# Altium footprint library ICs And Semiconductors THD.PcbLib: 507 footprints (part 12 of 32)
Each footprint in its own frame and in the unit in brackets; x right, y up, seen from the top. Pads: shape width x height; smd on the part's side, far side on the other; paste and mask are expansions set on the pad; w line width, h text height; cw(c..) or ccw(c..) is an arc to the next point about the centre after c.
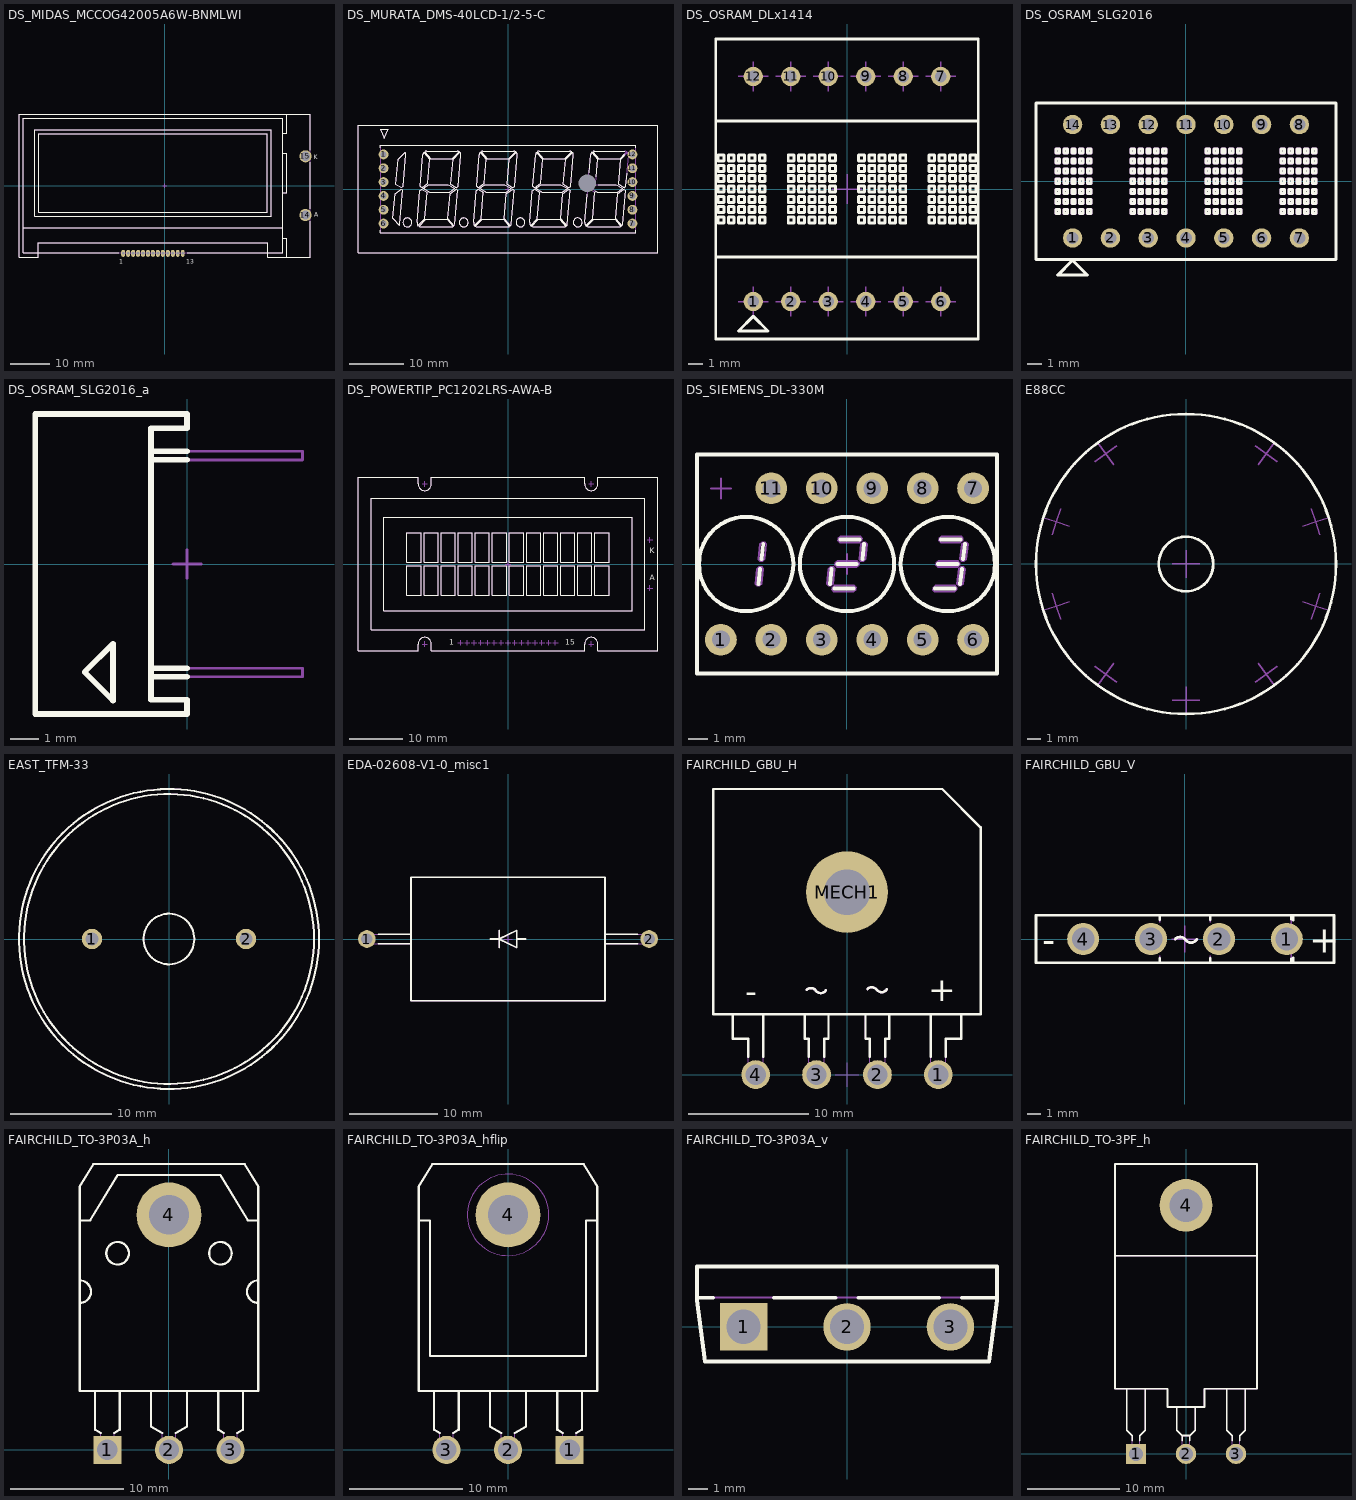
[diagram p11: the footprints below, top view; thin cyan lines are the x and y axes]

## DS_MIDAS_MCCOG42005A6W-BNMLWI [mm] "LCD Display 20 Characters (5x8 Dots) x 4 Lines, I2C, Body 74.5x36.6mm"
height 6.3
pads (15):
  oval 1x1.8 hole 0.7: 1(-10.62,-17.3) 2(-9.35,-17.3) 3(-8.08,-17.3) 4(-6.81,-17.3) 5(-5.54,-17.3) 6(-4.27,-17.3) 7(-3,-17.3) 8(-1.73,-17.3) 9(-0.46,-17.3) 10(0.81,-17.3) 11(2.08,-17.3) 12(3.35,-17.3) 13(4.62,-17.3)
  round 3.1 hole 2.4: 14(36,-7.5) 15(36,7.5)
Top Overlay:
  lines w0.2: -36.15,-10.7 30.15,-10.7 ; -11.72,-17.2 -36.15,-17.2 -36.15,17.2 30.15,17.2 30.15,-17.2 5.72,-17.2 ; 26.25,-7.84 27.25,-7.84 ; 30.15,-13.4 31.25,-13.4 31.25,-18.3 ; 30.15,-1.75 31.25,-1.75 31.25,8.25 30.15,8.25 ; 30.15,13.4 31.25,13.4 31.25,18.3 ; 37.25,-9.05 37.25,-18.3 31.25,-18.3 ; 37.25,-5.95 37.25,5.95 ; 37.25,9.05 37.25,18.3 -37.25,18.3 -37.25,-18.3 -32.35,-18.3 -32.35,-14.55 26.35,-14.55 26.35,-18.3 31.25,-18.3 ; 27.25,-7.84 -33.25,-7.84 -33.25,14.34 27.25,14.34 27.25,-7.84 ; -32.25,-6.84 26.25,-6.84 26.25,13.34 -32.25,13.34 -32.25,-6.84
  text "1" at -11.6,-20 h1.16
  text "13" at 5.539,-19.916 h1.16
  text "A" at 38.3,-8 h1.16
  text "K" at 38.1,6.8 h1.16
Notvisible:
  lines w0.05: -11.12,-17.3 -10.62,-17.3 ; -10.62,-17.8 -10.62,-17.3 ; -10.62,-16.8 -10.62,-17.3 ; -10.12,-17.3 -10.62,-17.3 ; -9.85,-17.3 -9.35,-17.3 ; -9.35,-17.8 -9.35,-17.3 ; -9.35,-16.8 -9.35,-17.3 ; -8.85,-17.3 -9.35,-17.3 ; -8.58,-17.3 -8.08,-17.3 ; -8.08,-17.8 -8.08,-17.3 ; -8.08,-16.8 -8.08,-17.3 ; -7.58,-17.3 -8.08,-17.3 ; -7.31,-17.3 -6.81,-17.3 ; -6.81,-17.8 -6.81,-17.3 ; -6.81,-16.8 -6.81,-17.3 ; -6.31,-17.3 -6.81,-17.3 ; -6.04,-17.3 -5.54,-17.3 ; -5.54,-17.8 -5.54,-17.3 ; -5.54,-16.8 -5.54,-17.3 ; -5.04,-17.3 -5.54,-17.3 ; -4.77,-17.3 -4.27,-17.3 ; -4.27,-17.8 -4.27,-17.3 ; -4.27,-16.8 -4.27,-17.3 ; -3.77,-17.3 -4.27,-17.3 ; -3.5,-17.3 -3,-17.3 ; -3,-17.8 -3,-17.3 ; -3,-16.8 -3,-17.3 ; -2.5,-17.3 -3,-17.3 ; -2.23,-17.3 -1.73,-17.3 ; -1.73,-17.8 -1.73,-17.3 ; -1.73,-16.8 -1.73,-17.3 ; -1.23,-17.3 -1.73,-17.3 ; -0.96,-17.3 -0.46,-17.3 ; -0.5,0 0,0 ; -0.46,-17.8 -0.46,-17.3 ; -0.46,-16.8 -0.46,-17.3 ; 0,-0.5 0,0 ; 0,0.5 0,0 ; 0.04,-17.3 -0.46,-17.3 ; 0.31,-17.3 0.81,-17.3 ; 0.5,0 0,0 ; 0.81,-17.8 0.81,-17.3 ; 0.81,-16.8 0.81,-17.3 ; 1.31,-17.3 0.81,-17.3 ; 1.58,-17.3 2.08,-17.3 ; 2.08,-17.8 2.08,-17.3 ; 2.08,-16.8 2.08,-17.3 ; 2.58,-17.3 2.08,-17.3 ; 2.85,-17.3 3.35,-17.3 ; 3.35,-17.8 3.35,-17.3 ; 3.35,-16.8 3.35,-17.3 ; 3.85,-17.3 3.35,-17.3 ; 4.12,-17.3 4.62,-17.3 ; 4.62,-17.8 4.62,-17.3 ; 4.62,-16.8 4.62,-17.3 ; 5.12,-17.3 4.62,-17.3 ; 35.5,-7.5 36,-7.5 ; 35.5,7.5 36,7.5 ; 36,-8 36,-7.5 ; 36,-7 36,-7.5 ; 36,7 36,7.5 ; 36,8 36,7.5 ; 36.5,-7.5 36,-7.5 ; 36.5,7.5 36,7.5
Mechanical 14:
  lines w0.1: -36.15,-10.7 30.15,-10.7 ; 30.15,-13.4 31.25,-13.4 31.25,-18.3 ; 30.15,-1.75 31.25,-1.75 31.25,8.25 30.15,8.25 ; 30.15,13.4 31.25,13.4 31.25,18.3 ; 31.25,-18.3 37.25,-18.3 37.25,18.3 -37.25,18.3 -37.25,-18.3 -32.35,-18.3 -32.35,-14.55 26.35,-14.55 26.35,-18.3 31.25,-18.3 ; -36.15,-17.2 -36.15,17.2 30.15,17.2 30.15,-17.2 -36.15,-17.2 ; -33.25,-7.84 27.25,-7.84 27.25,14.34 -33.25,14.34 -33.25,-7.84 ; -32.25,-6.84 26.25,-6.84 26.25,13.34 -32.25,13.34 -32.25,-6.84
  text "1" at -11.6,-20 h1.16
  text "13" at 5.539,-19.916 h1.16
  text "A" at 38.3,-8 h1.16
  text "K" at 38.2,6.9 h1.16
3D body "DS_MIDAS_MCCOG42005A6W-BNMLWI_part1.stp": height 6.2, standoff -3.6, extent -37.25,-18.3 37.25,18.3
3D body "DS_MIDAS_MCCOG42005A6W-BNMLWI_part2.stp": height 6.3, standoff 3, extent -37.25,-18.3 31.25,18.3

## DS_MURATA_DMS-40LCD-1/2-5-C [mm] "4 1/2 Digit, LCD Display Digital Panel Voltmeters, Body 55.1x23.4mm"
height 10.92
pads (13):
  round 1.8 hole 1.1: 1(-22.85,6.35) 2(-22.85,3.81) 3(-22.85,1.27) 4(-22.85,-1.27) 5(-22.85,-3.81) 6(-22.85,-6.35) 7(22.85,-6.35) 8(22.85,-3.81) 9(22.85,-1.27) 10(22.85,1.27) 11(22.85,3.81) 12(22.85,6.35)
  round 1 hole 3.2 unplated mask+1.1: 13(14.59,1.02)
Top Overlay:
  drawing of 191 lines, arcs and shapes, not listed
Notvisible:
  lines w0.1: -23.35,-6.35 -22.85,-6.35 ; -23.35,-3.81 -22.85,-3.81 ; -23.35,-1.27 -22.85,-1.27 ; -23.35,1.27 -22.85,1.27 ; -23.35,3.81 -22.85,3.81 ; -23.35,6.35 -22.85,6.35 ; -22.85,-6.85 -22.85,-6.35 ; -22.85,-5.85 -22.85,-6.35 ; -22.85,-4.31 -22.85,-3.81 ; -22.85,-3.31 -22.85,-3.81 ; -22.85,-1.77 -22.85,-1.27 ; -22.85,-0.77 -22.85,-1.27 ; -22.85,0.77 -22.85,1.27 ; -22.85,1.77 -22.85,1.27 ; -22.85,3.31 -22.85,3.81 ; -22.85,4.31 -22.85,3.81 ; -22.85,5.85 -22.85,6.35 ; -22.85,6.85 -22.85,6.35 ; -22.35,-6.35 -22.85,-6.35 ; -22.35,-3.81 -22.85,-3.81 ; -22.35,-1.27 -22.85,-1.27 ; -22.35,1.27 -22.85,1.27 ; -22.35,3.81 -22.85,3.81 ; -22.35,6.35 -22.85,6.35 ; -0.5,0 0,0 ; 0,-0.5 0,0 ; 0,0.5 0,0 ; 0.5,0 0,0 ; 14.09,1.02 14.59,1.02 ; 14.59,0.52 14.59,1.02 ; 14.59,1.52 14.59,1.02 ; 15.09,1.02 14.59,1.02 ; 22.35,-6.35 22.85,-6.35 ; 22.35,-3.81 22.85,-3.81 ; 22.35,-1.27 22.85,-1.27 ; 22.35,1.27 22.85,1.27 ; 22.35,3.81 22.85,3.81 ; 22.35,6.35 22.85,6.35 ; 22.85,-6.85 22.85,-6.35 ; 22.85,-5.85 22.85,-6.35 ; 22.85,-4.31 22.85,-3.81 ; 22.85,-3.31 22.85,-3.81 ; 22.85,-1.77 22.85,-1.27 ; 22.85,-0.77 22.85,-1.27 ; 22.85,0.77 22.85,1.27 ; 22.85,1.77 22.85,1.27 ; 22.85,3.31 22.85,3.81 ; 22.85,4.31 22.85,3.81 ; 22.85,5.85 22.85,6.35 ; 22.85,6.85 22.85,6.35 ; 23.35,-6.35 22.85,-6.35 ; 23.35,-3.81 22.85,-3.81 ; 23.35,-1.27 22.85,-1.27 ; 23.35,1.27 22.85,1.27 ; 23.35,3.81 22.85,3.81 ; 23.35,6.35 22.85,6.35
Mechanical 14:
  drawing of 195 lines, arcs and shapes, not listed
3D body "DS_MURATA_DMS-40LCD-1-2-5-C.stp": height 10.92, standoff -3.58, extent -27.55,-11.7 27.55,11.7

## DS_OSRAM_DLx1414 [mm] "0.145\" 4-Character 5 x 7 Dot Matrix Alphanumeric Intelligent Red Display, Body 20.32x17.78mm"
height 6.1
pads (12):
  round 1.3 hole 0.8: 1(-6.35,-7.62) 2(-3.81,-7.62) 3(-1.27,-7.62) 4(1.27,-7.62) 5(3.81,-7.62) 6(6.35,-7.62) 7(6.35,7.62) 8(3.81,7.62) 9(1.27,7.62) 10(-1.27,7.62) 11(-3.81,7.62) 12(-6.35,7.62)
Top Overlay:
  drawing of 571 lines, arcs and shapes, not listed
Notvisible:
  lines w0.1: -7.35,-7.62 -6.35,-7.62 ; -7.35,7.62 -6.35,7.62 ; -6.35,-8.62 -6.35,-7.62 ; -6.35,-6.62 -6.35,-7.62 ; -6.35,6.62 -6.35,7.62 ; -6.35,8.62 -6.35,7.62 ; -5.35,-7.62 -6.35,-7.62 ; -5.35,7.62 -6.35,7.62 ; -4.81,-7.62 -3.81,-7.62 ; -4.81,7.62 -3.81,7.62 ; -3.81,-8.62 -3.81,-7.62 ; -3.81,-6.62 -3.81,-7.62 ; -3.81,6.62 -3.81,7.62 ; -3.81,8.62 -3.81,7.62 ; -2.81,-7.62 -3.81,-7.62 ; -2.81,7.62 -3.81,7.62 ; -2.27,-7.62 -1.27,-7.62 ; -2.27,7.62 -1.27,7.62 ; -1.27,-8.62 -1.27,-7.62 ; -1.27,-6.62 -1.27,-7.62 ; -1.27,6.62 -1.27,7.62 ; -1.27,8.62 -1.27,7.62 ; -1,0 0,0 ; -0.27,-7.62 -1.27,-7.62 ; -0.27,7.62 -1.27,7.62 ; 0,-1 0,0 ; 0,1 0,0 ; 0.27,-7.62 1.27,-7.62 ; 0.27,7.62 1.27,7.62 ; 1,0 0,0 ; 1.27,-8.62 1.27,-7.62 ; 1.27,-6.62 1.27,-7.62 ; 1.27,6.62 1.27,7.62 ; 1.27,8.62 1.27,7.62 ; 2.27,-7.62 1.27,-7.62 ; 2.27,7.62 1.27,7.62 ; 2.81,-7.62 3.81,-7.62 ; 2.81,7.62 3.81,7.62 ; 3.81,-8.62 3.81,-7.62 ; 3.81,-6.62 3.81,-7.62 ; 3.81,6.62 3.81,7.62 ; 3.81,8.62 3.81,7.62 ; 4.81,-7.62 3.81,-7.62 ; 4.81,7.62 3.81,7.62 ; 5.35,-7.62 6.35,-7.62 ; 5.35,7.62 6.35,7.62 ; 6.35,-8.62 6.35,-7.62 ; 6.35,-6.62 6.35,-7.62 ; 6.35,6.62 6.35,7.62 ; 6.35,8.62 6.35,7.62 ; 7.35,-7.62 6.35,-7.62 ; 7.35,7.62 6.35,7.62
Mechanical 14:
  drawing of 571 lines, arcs and shapes, not listed
3D body "DS_OSRAM_DLx1414.stp": height 6.1, standoff -3.63, extent -8.89,-10.16 8.89,10.16

## DS_OSRAM_SLG2016 [mm] "0.145\" 4-Character 5 x 7 Dot Matrix Alphanumeric Intelligent Display, Body 19.91x10.16mm"
height 5.08
pads (14):
  round 1.3 hole 0.8: 1(-7.62,-3.81) 2(-5.08,-3.81) 3(-2.54,-3.81) 4(0,-3.81) 5(2.54,-3.81) 6(5.08,-3.81) 7(7.62,-3.81) 8(7.62,3.81) 9(5.08,3.81) 10(2.54,3.81) 11(0,3.81) 12(-2.54,3.81) 13(-5.08,3.81) 14(-7.62,3.81)
Top Overlay:
  drawing of 569 lines, arcs and shapes, not listed
Notvisible:
  lines w0.1: -8.12,-3.81 -7.62,-3.81 ; -8.12,3.81 -7.62,3.81 ; -7.62,-4.31 -7.62,-3.81 ; -7.62,-3.31 -7.62,-3.81 ; -7.62,3.31 -7.62,3.81 ; -7.62,4.31 -7.62,3.81 ; -7.12,-3.81 -7.62,-3.81 ; -7.12,3.81 -7.62,3.81 ; -5.58,-3.81 -5.08,-3.81 ; -5.58,3.81 -5.08,3.81 ; -5.08,-4.31 -5.08,-3.81 ; -5.08,-3.31 -5.08,-3.81 ; -5.08,3.31 -5.08,3.81 ; -5.08,4.31 -5.08,3.81 ; -4.58,-3.81 -5.08,-3.81 ; -4.58,3.81 -5.08,3.81 ; -3.04,-3.81 -2.54,-3.81 ; -3.04,3.81 -2.54,3.81 ; -2.54,-4.31 -2.54,-3.81 ; -2.54,-3.31 -2.54,-3.81 ; -2.54,3.31 -2.54,3.81 ; -2.54,4.31 -2.54,3.81 ; -2.04,-3.81 -2.54,-3.81 ; -2.04,3.81 -2.54,3.81 ; -0.5,-3.81 0,-3.81 ; -0.5,3.81 0,3.81 ; 0,-4.31 0,-3.81 ; 0,-3.31 0,-3.81 ; 0,3.31 0,3.81 ; 0,4.31 0,3.81 ; 0.5,-3.81 0,-3.81 ; 0.5,3.81 0,3.81 ; 2.04,-3.81 2.54,-3.81 ; 2.04,3.81 2.54,3.81 ; 2.54,-4.31 2.54,-3.81 ; 2.54,-3.31 2.54,-3.81 ; 2.54,3.31 2.54,3.81 ; 2.54,4.31 2.54,3.81 ; 3.04,-3.81 2.54,-3.81 ; 3.04,3.81 2.54,3.81 ; 4.58,-3.81 5.08,-3.81 ; 4.58,3.81 5.08,3.81 ; 5.08,-4.31 5.08,-3.81 ; 5.08,-3.31 5.08,-3.81 ; 5.08,3.31 5.08,3.81 ; 5.08,4.31 5.08,3.81 ; 5.58,-3.81 5.08,-3.81 ; 5.58,3.81 5.08,3.81 ; 7.12,-3.81 7.62,-3.81 ; 7.12,3.81 7.62,3.81 ; 7.62,-4.31 7.62,-3.81 ; 7.62,-3.31 7.62,-3.81 ; 7.62,3.31 7.62,3.81 ; 7.62,4.31 7.62,3.81 ; 8.12,-3.81 7.62,-3.81 ; 8.12,3.81 7.62,3.81
Mechanical 14:
  drawing of 569 lines, arcs and shapes, not listed
3D body "DS_OSRAM_SLG2016.stp": height 5.33, standoff -3.35, extent -10.08,-5.27 10.08,5.27

## DS_OSRAM_SLG2016_a [mm] "0.145\" 4-Character 5 x 7 Dot Matrix Alphanumeric Intelligent Display, Body 19.91x10.16mm"
height 5.08
Top Overlay:
  lines w0.2: -1.27,-3.96 0,-3.96 ; -1.27,-3.66 0,-3.66 ; -1.27,3.66 0,3.66 ; -1.27,3.96 0,3.96 ; -3.6,-3.8 -2.6,-2.8 -2.6,-4.8 -3.6,-3.8 ; -3.6,-3.8 -3.6,-3.8 ; -5.33,-5.27 0,-5.27 0,-4.77 -1.27,-4.77 -1.27,4.77 0,4.77 0,5.27 -5.33,5.27 -5.33,-5.27
Notvisible:
  lines w0.1: -0.5,0 0,0 ; 0,-0.5 0,0 ; 0,0.5 0,0 ; 0.5,0 0,0
Mechanical 14:
  lines w0.1: -1.27,-3.96 4.06,-3.96 4.06,-3.66 -1.27,-3.66 ; -1.27,3.66 4.06,3.66 4.06,3.96 -1.27,3.96 ; -3.6,-3.8 -2.6,-2.8 -2.6,-4.8 -3.6,-3.8 ; -3.6,-3.8 -3.6,-3.8 ; -3.6,-3.8 -3.6,-3.8 ; -5.33,-5.27 0,-5.27 0,-4.77 -1.27,-4.77 -1.27,4.77 0,4.77 0,5.27 -5.33,5.27 -5.33,-5.27
3D body "DS_OSRAM_SLG2016_a.stp": height 20.16, standoff 0, extent -5.33,-5.27 4.06,5.27

## DS_POWERTIP_PC1202LRS-AWA-B [mm] "Alphanumeric LCD Display Module, 2 x 12 characters, Dot Size:0.45 x 0.60, Dot Pitch 0.55 x 0.70, With LED Backlight Yellow-Green"
height 12.8
Top Overlay:
  lines w0.2: -28.1,-16.25 -16.85,-16.25 -16.85,-15 cw(c-15.6,-15) -14.35,-15 -14.35,-16.25 14.35,-16.25 14.35,-15 cw(c15.6,-15) 16.85,-15 16.85,-16.25 28.1,-16.25 28.1,16.25 16.85,16.25 16.85,15 cw(c15.6,15) 14.35,15 14.35,16.25 -14.35,16.25 -14.35,15 cw(c-15.6,15) -16.85,15 -16.85,16.25 -28.1,16.25 -28.1,-16.25 ; -25.65,-12.35 -25.65,12.35 25.65,12.35 25.65,-12.35 -25.65,-12.35 ; -23.25,-8.75 -23.25,8.75 23.25,8.75 23.25,-8.75 -23.25,-8.75 ; -18.925,-5.85 -16.275,-5.85 -16.275,-0.35 -18.925,-0.35 -18.925,-5.85 ; -18.925,0.35 -16.275,0.35 -16.275,5.85 -18.925,5.85 -18.925,0.35 ; -15.725,-5.85 -15.725,-0.35 -13.075,-0.35 -13.075,-5.85 -15.725,-5.85 ; -15.725,0.35 -15.725,5.85 -13.075,5.85 -13.075,0.35 -15.725,0.35 ; -12.525,-5.85 -12.525,-0.35 -9.875,-0.35 -9.875,-5.85 -12.525,-5.85 ; -12.525,0.35 -12.525,5.85 -9.875,5.85 -9.875,0.35 -12.525,0.35 ; -9.325,-5.85 -9.325,-0.35 -6.675,-0.35 -6.675,-5.85 -9.325,-5.85 ; -9.325,0.35 -9.325,5.85 -6.675,5.85 -6.675,0.35 -9.325,0.35 ; -6.125,-5.85 -6.125,-0.35 -3.475,-0.35 -3.475,-5.85 -6.125,-5.85 ; -6.125,0.35 -6.125,5.85 -3.475,5.85 -3.475,0.35 -6.125,0.35 ; -2.925,-5.85 -2.925,-0.35 -0.275,-0.35 -0.275,-5.85 -2.925,-5.85 ; -2.925,0.35 -2.925,5.85 -0.275,5.85 -0.275,0.35 -2.925,0.35 ; 0.275,-5.85 0.275,-0.35 2.925,-0.35 2.925,-5.85 0.275,-5.85 ; 0.275,0.35 0.275,5.85 2.925,5.85 2.925,0.35 0.275,0.35 ; 3.475,-5.85 3.475,-0.35 6.125,-0.35 6.125,-5.85 3.475,-5.85 ; 3.475,0.35 3.475,5.85 6.125,5.85 6.125,0.35 3.475,0.35 ; 6.675,-5.85 6.675,-0.35 9.325,-0.35 9.325,-5.85 6.675,-5.85 ; 6.675,0.35 6.675,5.85 9.325,5.85 9.325,0.35 6.675,0.35 ; 9.875,-5.85 9.875,-0.35 12.525,-0.35 12.525,-5.85 9.875,-5.85 ; 9.875,0.35 9.875,5.85 12.525,5.85 12.525,0.35 9.875,0.35 ; 13.075,-5.85 13.075,-0.35 15.725,-0.35 15.725,-5.85 13.075,-5.85 ; 13.075,0.35 13.075,5.85 15.725,5.85 15.725,0.35 13.075,0.35 ; 16.275,-5.85 16.275,-0.35 18.925,-0.35 18.925,-5.85 16.275,-5.85 ; 16.275,0.35 16.275,5.85 18.925,5.85 18.925,0.35 16.275,0.35
  text "1" at -11.008,-15.135 h1
  text "15" at 10.717,-15.11 h1
  text "A" at 26.592,-3.045 h1
  text "K" at 26.592,2.035 h1
Notvisible:
  lines w0.1: -16.1,-15 -15.6,-15 ; -16.1,15 -15.6,15 ; -15.6,-15.5 -15.6,-15 ; -15.6,-14.5 -15.6,-15 ; -15.6,14.5 -15.6,15 ; -15.6,15.5 -15.6,15 ; -15.1,-15 -15.6,-15 ; -15.1,15 -15.6,15 ; -9.39,-14.75 -8.89,-14.75 ; -8.89,-15.25 -8.89,-14.75 ; -8.89,-14.25 -8.89,-14.75 ; -8.39,-14.75 -8.89,-14.75 ; -8.12,-14.75 -7.62,-14.75 ; -7.62,-15.25 -7.62,-14.75 ; -7.62,-14.25 -7.62,-14.75 ; -7.12,-14.75 -7.62,-14.75 ; -6.85,-14.75 -6.35,-14.75 ; -6.35,-15.25 -6.35,-14.75 ; -6.35,-14.25 -6.35,-14.75 ; -5.85,-14.75 -6.35,-14.75 ; -5.58,-14.75 -5.08,-14.75 ; -5.08,-15.25 -5.08,-14.75 ; -5.08,-14.25 -5.08,-14.75 ; -4.58,-14.75 -5.08,-14.75 ; -4.31,-14.75 -3.81,-14.75 ; -3.81,-15.25 -3.81,-14.75 ; -3.81,-14.25 -3.81,-14.75 ; -3.31,-14.75 -3.81,-14.75 ; -3.04,-14.75 -2.54,-14.75 ; -2.54,-15.25 -2.54,-14.75 ; -2.54,-14.25 -2.54,-14.75 ; -2.04,-14.75 -2.54,-14.75 ; -1.77,-14.75 -1.27,-14.75 ; -1.27,-15.25 -1.27,-14.75 ; -1.27,-14.25 -1.27,-14.75 ; -0.77,-14.75 -1.27,-14.75 ; -0.5,-14.75 0,-14.75 ; -0.5,0 0,0 ; 0,-15.25 0,-14.75 ; 0,-14.25 0,-14.75 ; 0,-0.5 0,0 ; 0,0.5 0,0 ; 0.5,-14.75 0,-14.75 ; 0.5,0 0,0 ; 0.77,-14.75 1.27,-14.75 ; 1.27,-15.25 1.27,-14.75 ; 1.27,-14.25 1.27,-14.75 ; 1.77,-14.75 1.27,-14.75 ; 2.04,-14.75 2.54,-14.75 ; 2.54,-15.25 2.54,-14.75 ; 2.54,-14.25 2.54,-14.75 ; 3.04,-14.75 2.54,-14.75 ; 3.31,-14.75 3.81,-14.75 ; 3.81,-15.25 3.81,-14.75 ; 3.81,-14.25 3.81,-14.75 ; 4.31,-14.75 3.81,-14.75 ; 4.58,-14.75 5.08,-14.75 ; 5.08,-15.25 5.08,-14.75 ; 5.08,-14.25 5.08,-14.75 ; 5.58,-14.75 5.08,-14.75 ; 5.85,-14.75 6.35,-14.75 ; 6.35,-15.25 6.35,-14.75 ; 6.35,-14.25 6.35,-14.75 ; 6.85,-14.75 6.35,-14.75 ; 7.12,-14.75 7.62,-14.75 ; 7.62,-15.25 7.62,-14.75 ; 7.62,-14.25 7.62,-14.75 ; 8.12,-14.75 7.62,-14.75 ; 8.39,-14.75 8.89,-14.75 ; 8.89,-15.25 8.89,-14.75 ; 8.89,-14.25 8.89,-14.75 ; 9.39,-14.75 8.89,-14.75 ; 15.1,-15 15.6,-15 ; 15.1,15 15.6,15 ; 15.6,-15.5 15.6,-15 ; 15.6,-14.5 15.6,-15 ; 15.6,14.5 15.6,15 ; 15.6,15.5 15.6,15 ; 16.1,-15 15.6,-15 ; 16.1,15 15.6,15 ; 26.1,-4.5 26.6,-4.5 ; 26.1,4.5 26.6,4.5 ; 26.6,-5 26.6,-4.5 ; 26.6,-4 26.6,-4.5 ; 26.6,4 26.6,4.5 ; 26.6,5 26.6,4.5 ; 27.1,-4.5 26.6,-4.5 ; 27.1,4.5 26.6,4.5
Mechanical 14:
  lines w0.1: -28.1,-16.25 -16.85,-16.25 -16.85,-15 cw(c-15.6,-15) -14.35,-15 -14.35,-16.25 14.35,-16.25 14.35,-15 cw(c15.6,-15) 16.85,-15 16.85,-16.25 28.1,-16.25 28.1,16.25 16.85,16.25 16.85,15 cw(c15.6,15) 14.35,15 14.35,16.25 -14.35,16.25 -14.35,15 cw(c-15.6,15) -16.85,15 -16.85,16.25 -28.1,16.25 -28.1,-16.25 ; -25.65,-12.35 -25.65,12.35 25.65,12.35 25.65,-12.35 -25.65,-12.35 ; -23.25,-8.75 -23.25,8.75 23.25,8.75 23.25,-8.75 -23.25,-8.75 ; -18.925,-5.85 -16.275,-5.85 -16.275,-0.35 -18.925,-0.35 -18.925,-5.85 ; -18.925,0.35 -16.275,0.35 -16.275,5.85 -18.925,5.85 -18.925,0.35 ; -15.725,-5.85 -15.725,-0.35 -13.075,-0.35 -13.075,-5.85 -15.725,-5.85 ; -15.725,0.35 -15.725,5.85 -13.075,5.85 -13.075,0.35 -15.725,0.35 ; -12.525,-5.85 -12.525,-0.35 -9.875,-0.35 -9.875,-5.85 -12.525,-5.85 ; -12.525,0.35 -12.525,5.85 -9.875,5.85 -9.875,0.35 -12.525,0.35 ; -9.325,-5.85 -9.325,-0.35 -6.675,-0.35 -6.675,-5.85 -9.325,-5.85 ; -9.325,0.35 -9.325,5.85 -6.675,5.85 -6.675,0.35 -9.325,0.35 ; -6.125,-5.85 -6.125,-0.35 -3.475,-0.35 -3.475,-5.85 -6.125,-5.85 ; -6.125,0.35 -6.125,5.85 -3.475,5.85 -3.475,0.35 -6.125,0.35 ; -2.925,-5.85 -2.925,-0.35 -0.275,-0.35 -0.275,-5.85 -2.925,-5.85 ; -2.925,0.35 -2.925,5.85 -0.275,5.85 -0.275,0.35 -2.925,0.35 ; 0.275,-5.85 0.275,-0.35 2.925,-0.35 2.925,-5.85 0.275,-5.85 ; 0.275,0.35 0.275,5.85 2.925,5.85 2.925,0.35 0.275,0.35 ; 3.475,-5.85 3.475,-0.35 6.125,-0.35 6.125,-5.85 3.475,-5.85 ; 3.475,0.35 3.475,5.85 6.125,5.85 6.125,0.35 3.475,0.35 ; 6.675,-5.85 6.675,-0.35 9.325,-0.35 9.325,-5.85 6.675,-5.85 ; 6.675,0.35 6.675,5.85 9.325,5.85 9.325,0.35 6.675,0.35 ; 9.875,-5.85 9.875,-0.35 12.525,-0.35 12.525,-5.85 9.875,-5.85 ; 9.875,0.35 9.875,5.85 12.525,5.85 12.525,0.35 9.875,0.35 ; 13.075,-5.85 13.075,-0.35 15.725,-0.35 15.725,-5.85 13.075,-5.85 ; 13.075,0.35 13.075,5.85 15.725,5.85 15.725,0.35 13.075,0.35 ; 16.275,-5.85 16.275,-0.35 18.925,-0.35 18.925,-5.85 16.275,-5.85 ; 16.275,0.35 16.275,5.85 18.925,5.85 18.925,0.35 16.275,0.35
  text "1" at -11.008,-15.135 h1
  text "15" at 10.717,-15.11 h1
  text "A" at 26.592,-3.045 h1
  text "K" at 26.592,2.035 h1
3D body "DS_POWERTIP_PC1202LRS-AWA-B.stp": height 12.8, standoff 0, extent -28.1,-16.25 28.1,16.25

## DS_SIEMENS_DL-330M [mm] "Red Seven Segments Magnified Monolithic Numeric Display, Body 15.11x11.05mm"
height 5.84
pads (11):
  round 1.6 hole 0.9: 1(-6.35,-3.81) 2(-3.81,-3.81) 3(-1.27,-3.81) 4(1.27,-3.81) 5(3.81,-3.81) 6(6.35,-3.81) 7(6.35,3.81) 8(3.81,3.81) 9(1.27,3.81) 10(-1.27,3.81) 11(-3.81,3.81)
Top Overlay:
  circle w0.2: c5.08,0 r2.375
  circle w0.2: c0,0 r2.375
  circle w0.2: c-5.08,0 r2.375
  lines w0.2: -4.463,-0.996 -4.372,-0.249 ; -4.31,0.249 -4.219,0.996 ; -0.861,-0.996 -0.769,-0.249 ; -0.641,-1.245 0.335,-1.245 ; -0.488,0 0.488,0 ; -0.335,1.245 0.641,1.245 ; 0.77,0.249 0.861,0.996 ; 4.439,-1.245 5.415,-1.245 ; 4.592,0 5.568,0 ; 4.745,1.245 5.721,1.245 ; 5.697,-0.996 5.788,-0.249 ; 5.85,0.249 5.941,0.996 ; -7.555,-5.525 -7.555,5.525 7.555,5.525 7.555,-5.525 -7.555,-5.525
Notvisible:
  lines w0.1: -6.85,-3.81 -6.35,-3.81 ; -6.85,3.81 -6.35,3.81 ; -6.35,-4.31 -6.35,-3.81 ; -6.35,-3.31 -6.35,-3.81 ; -6.35,3.31 -6.35,3.81 ; -6.35,4.31 -6.35,3.81 ; -5.85,-3.81 -6.35,-3.81 ; -5.85,3.81 -6.35,3.81 ; -4.31,-3.81 -3.81,-3.81 ; -4.31,3.81 -3.81,3.81 ; -3.81,-4.31 -3.81,-3.81 ; -3.81,-3.31 -3.81,-3.81 ; -3.81,3.31 -3.81,3.81 ; -3.81,4.31 -3.81,3.81 ; -3.31,-3.81 -3.81,-3.81 ; -3.31,3.81 -3.81,3.81 ; -1.77,-3.81 -1.27,-3.81 ; -1.77,3.81 -1.27,3.81 ; -1.27,-4.31 -1.27,-3.81 ; -1.27,-3.31 -1.27,-3.81 ; -1.27,3.31 -1.27,3.81 ; -1.27,4.31 -1.27,3.81 ; -0.77,-3.81 -1.27,-3.81 ; -0.77,3.81 -1.27,3.81 ; -0.5,0 0,0 ; 0,-0.5 0,0 ; 0,0.5 0,0 ; 0.5,0 0,0 ; 0.77,-3.81 1.27,-3.81 ; 0.77,3.81 1.27,3.81 ; 1.27,-4.31 1.27,-3.81 ; 1.27,-3.31 1.27,-3.81 ; 1.27,3.31 1.27,3.81 ; 1.27,4.31 1.27,3.81 ; 1.77,-3.81 1.27,-3.81 ; 1.77,3.81 1.27,3.81 ; 3.31,-3.81 3.81,-3.81 ; 3.31,3.81 3.81,3.81 ; 3.81,-4.31 3.81,-3.81 ; 3.81,-3.31 3.81,-3.81 ; 3.81,3.31 3.81,3.81 ; 3.81,4.31 3.81,3.81 ; 4.31,-3.81 3.81,-3.81 ; 4.31,3.81 3.81,3.81 ; 5.85,-3.81 6.35,-3.81 ; 5.85,3.81 6.35,3.81 ; 6.35,-4.31 6.35,-3.81 ; 6.35,-3.31 6.35,-3.81 ; 6.35,3.31 6.35,3.81 ; 6.35,4.31 6.35,3.81 ; 6.85,-3.81 6.35,-3.81 ; 6.85,3.81 6.35,3.81
Mechanical 14:
  circle w0.1: c5.08,0 r2.375
  circle w0.1: c0,0 r2.375
  circle w0.1: c-5.08,0 r2.375
  lines w0.1: -7.555,-5.525 -7.555,5.525 7.555,5.525 7.555,-5.525 -7.555,-5.525 ; -4.614,-0.996 -4.523,-0.249 -4.411,-0.15 -4.308,-0.15 -4.221,-0.249 -4.312,-0.996 -4.424,-1.095 -4.527,-1.095 -4.614,-0.996 ; -4.462,0.249 -4.37,0.996 -4.258,1.095 -4.156,1.095 -4.068,0.996 -4.159,0.249 -4.272,0.15 -4.374,0.15 -4.462,0.249 ; -1.012,-0.996 -0.924,-1.095 -0.822,-1.095 -0.71,-0.996 -0.618,-0.249 -0.706,-0.15 -0.808,-0.15 -0.921,-0.249 -1.012,-0.996 ; -0.747,-1.296 -0.734,-1.194 -0.622,-1.095 0.353,-1.095 0.441,-1.194 0.429,-1.296 0.317,-1.395 -0.659,-1.395 -0.747,-1.296 ; -0.594,-0.051 -0.581,0.051 -0.469,0.15 0.506,0.15 0.594,0.051 0.582,-0.051 0.469,-0.15 -0.506,-0.15 -0.594,-0.051 ; -0.441,1.194 -0.429,1.296 -0.316,1.395 0.659,1.395 0.747,1.296 0.734,1.194 0.622,1.095 -0.353,1.095 -0.441,1.194 ; 0.618,0.249 0.71,0.996 0.822,1.095 0.924,1.095 1.012,0.996 0.921,0.249 0.808,0.15 0.706,0.15 0.618,0.249 ; 4.333,-1.296 4.346,-1.194 4.458,-1.095 5.433,-1.095 5.521,-1.194 5.509,-1.296 5.397,-1.395 4.421,-1.395 4.333,-1.296 ; 4.486,-0.051 4.499,0.051 4.611,0.15 5.586,0.15 5.674,0.051 5.662,-0.051 5.549,-0.15 4.574,-0.15 4.486,-0.051 ; 4.639,1.194 4.651,1.296 4.764,1.395 5.739,1.395 5.827,1.296 5.814,1.194 5.702,1.095 4.727,1.095 4.639,1.194 ; 5.546,-0.996 5.637,-0.249 5.749,-0.15 5.852,-0.15 5.939,-0.249 5.848,-0.996 5.736,-1.095 5.633,-1.095 5.546,-0.996 ; 5.698,0.249 5.79,0.996 5.902,1.095 6.005,1.095 6.092,0.996 6.001,0.249 5.888,0.15 5.786,0.15 5.698,0.249
3D body "DS_SIEMENS_DL-330M_Part2.stp": height 5.84, standoff 0, extent -7.455,-5.525 7.455,5.525
3D body "DS_SIEMENS_DL-330M_Part1.stp": height 4.51, standoff -4.06, extent -7.555,-5.525 7.555,5.525

## E88CC [mm] "Dual Triode E88CC"
height 60.1
Top Overlay:
  circle w0.2: c0,0 r2
  circle w0.2: c0,0 r11
Notvisible:
  lines w0.1: -10.462,-3.399 -9.511,-3.09 ; -10.462,3.399 -9.511,3.09 ; -9.82,-2.139 -9.511,-3.09 ; -9.82,2.139 -9.511,3.09 ; -9.202,-4.041 -9.511,-3.09 ; -9.202,4.041 -9.511,3.09 ; -8.56,-2.781 -9.511,-3.09 ; -8.56,2.781 -9.511,3.09 ; -6.687,-7.502 -5.878,-8.09 ; -6.687,7.502 -5.878,8.09 ; -6.466,-8.899 -5.878,-8.09 ; -6.466,8.899 -5.878,8.09 ; -5.29,-7.281 -5.878,-8.09 ; -5.29,7.281 -5.878,8.09 ; -5.069,-8.678 -5.878,-8.09 ; -5.069,8.678 -5.878,8.09 ; -1,-10 0,-10 ; -1,0 0,0 ; 0,-11 0,-10 ; 0,-9 0,-10 ; 0,-1 0,0 ; 0,1 0,0 ; 1,-10 0,-10 ; 1,0 0,0 ; 5.069,-8.678 5.878,-8.09 ; 5.069,8.678 5.878,8.09 ; 5.29,-7.281 5.878,-8.09 ; 5.29,7.281 5.878,8.09 ; 6.466,-8.899 5.878,-8.09 ; 6.466,8.899 5.878,8.09 ; 6.687,-7.502 5.878,-8.09 ; 6.687,7.502 5.878,8.09 ; 8.56,-2.781 9.511,-3.09 ; 8.56,2.781 9.511,3.09 ; 9.202,-4.041 9.511,-3.09 ; 9.202,4.041 9.511,3.09 ; 9.82,-2.139 9.511,-3.09 ; 9.82,2.139 9.511,3.09 ; 10.462,-3.399 9.511,-3.09 ; 10.462,3.399 9.511,3.09
Mechanical 14:
  circle w0.1: c0,0 r2
  circle w0.1: c0,0 r11
3D body "E88CC.stp": height 63.2, standoff 7.6, extent -11,-11 11,11

## EAST_TFM-33 [mm] "EAST Piezo Transducer, Body Dia. 29.6mm, Pitch 15.2mm"
height 7.5
pads (2):
  round 2 hole 1.3: 1(-7.6,0) 2(7.6,0)
Top Overlay:
  circle w0.2: c0,0 r2.5
  circle w0.2: c0,0 r14.3
  circle w0.2: c0,0 r14.8
Mechanical 14:
  circle w0.1: c0,0 r14.8
  circle w0.1: c0,0 r14.3
  circle w0.1: c0,0 r2.5
  circle w0.1: c7.6,0 r0.5
  circle w0.1: c-7.6,0 r0.5
3D body "EAST_TFM-33.stp": height 7.5, standoff -3.6, extent -14.8,-14.796 14.8,14.796

## EDA-02608-V1-0_misc1 [mm] "Diode Molded in ABS Box, Lead Spacing 28mm, Body L 22mm X W 14mm x H 12mm"
height 5.46
pads (2):
  round 2 hole 1.3: 1(-16,0) 2(16,0)
Top Overlay:
  lines w0.2: -14.713,-0.55 -11,-0.55 ; -14.713,0.55 -11,0.55 ; -2,0 -1,0 ; -1,-1 -1,1 ; 1,0 2,0 ; 11,-0.546 14.712,-0.549 ; 11,0.549 14.712,0.55 ; -1,0 1,1 1,-1 -1,0 ; -11,-7 -11,7 11,7 11,-7 -11,-7
Notvisible:
  lines w0.1: -16.5,0 -16,0 ; -16,-0.5 -16,0 ; -16,0.5 -16,0 ; -15.5,0 -16,0 ; -0.5,0 0,0 ; 0,-0.5 0,0 ; 0,0.5 0,0 ; 0.5,0 0,0 ; 15.5,0 16,0 ; 16,-0.5 16,0 ; 16,0.5 16,0 ; 16.5,0 16,0
Mechanical 14:
  lines w0.1: -11,-0.55 -16,-0.55 cw(c-16,0) -16,0.55 -11,0.55 ; -2,0 -1,0 ; -1,-1 -1,1 ; 1,0 2,0 ; 11,-0.546 16,-0.55 ccw(c16,0) 16,0.55 11,0.549 ; -1,0 1,-1 1,1 -1,0 ; -11,-7 -11,7 11,7 11,-7 -11,-7
3D body "EDA-02608-V1-0_misc1.stp": height 12.05, standoff -3.6, extent -16.55,-7 16.55,7

## FAIRCHILD_GBU_H [mm] "Glass Passivated Single-Phase Bridge Rectifier, Body 22.3mm x 18.8mm"
height 3.56
pads (5):
  round 2.4 hole 1.7: 1(7.62,0) 2(2.54,0) 3(-2.54,0) 4(-7.62,0)
  round 6.8 hole 3.8: MECH1(0,15.23)
Top Overlay:
  lines w0.2: -9.525,5.03 -9.525,3 -8.255,3 -8.255,1.5 ; -6.985,1.5 -6.985,5.03 ; -3.54,5.03 -3.54,3 -3.175,3 -3.175,1.5 ; -3.37,7.068 cw(c-3.01,6.721) -2.595,7 ; -2.57,6.98 ccw(c-2.189,7.304) -1.76,7.046 ; -1.905,1.5 -1.905,3 -1.54,3 -1.54,5.03 ; 1.54,5.03 1.54,3 1.905,3 1.905,1.5 ; 1.71,7.136 cw(c2.07,6.79) 2.485,7.068 ; 2.51,7.048 ccw(c2.891,7.372) 3.32,7.115 ; 3.175,1.5 3.175,3 3.54,3 3.54,5.03 ; 6.985,1.5 6.985,5.03 ; 8.255,1.5 8.255,3 9.525,3 9.525,5.03 ; -11.15,5.03 11.15,5.03 11.15,20.63 7.95,23.83 -11.15,23.83 -11.15,5.03
  text "+" at 6.77,6.12 h2
  text "-" at -8.5,6 h2
Notvisible:
  lines w0.1: -8.62,0 -7.62,0 ; -7.62,-1 -7.62,0 ; -7.62,1 -7.62,0 ; -6.62,0 -7.62,0 ; -3.54,0 -2.54,0 ; -2.54,-1 -2.54,0 ; -2.54,1 -2.54,0 ; -1.54,0 -2.54,0 ; -1,0 0,0 ; -1,15.23 0,15.23 ; 0,-1 0,0 ; 0,1 0,0 ; 0,14.23 0,15.23 ; 0,16.23 0,15.23 ; 1,0 0,0 ; 1,15.23 0,15.23 ; 1.54,0 2.54,0 ; 2.54,-1 2.54,0 ; 2.54,1 2.54,0 ; 3.54,0 2.54,0 ; 6.62,0 7.62,0 ; 7.62,-1 7.62,0 ; 7.62,1 7.62,0 ; 8.62,0 7.62,0
Mechanical 14:
  lines w0.1: -9.525,5.03 -9.525,3 -8.255,3 -8.255,-0.28 -6.985,-0.28 -6.985,5.03 ; -3.54,5.03 -3.54,3 -3.175,3 -3.175,-0.28 -1.905,-0.28 -1.905,3 -1.54,3 -1.54,5.03 ; 1.54,5.03 1.54,3 1.905,3 1.905,-0.28 3.175,-0.28 3.175,3 3.54,3 3.54,5.03 ; 6.985,5.03 6.985,-0.28 8.255,-0.28 8.255,3 9.525,3 9.525,5.03 ; -11.15,5.03 11.15,5.03 11.15,20.63 7.95,23.83 -11.15,23.83 -11.15,5.03 ; -1.9,14.28 ccw(c0,14.28) 1.9,14.28 1.9,16.18 ccw(c0,16.18) -1.9,16.18 -1.9,14.28
  lines w0.2: -3.37,7.068 cw(c-3.01,6.721) -2.595,7 ; -2.57,6.98 ccw(c-2.189,7.304) -1.76,7.046 ; 1.71,7.136 cw(c2.07,6.79) 2.485,7.068 ; 2.51,7.048 ccw(c2.891,7.372) 3.32,7.115
  text "+" at 6.77,6.12 h2
  text "-" at -8.5,6 h2
3D body "FAIRCHILD_GBU-H.stp": height 3.56, standoff -3.6, extent -11.15,-0.28 11.15,23.83

## FAIRCHILD_GBU_V [mm] "Glass Passivated Single-Phase Bridge Rectifier, Body 22.3mm x 3.56mm"
height 20.83
pads (4):
  round 2.4 hole 1.7: 1(7.62,0) 2(2.54,0) 3(-2.54,0) 4(-7.62,0)
Top Overlay:
  lines w0.2: -1.9,-1.78 -1.9,-1.45 ; -1.9,1.45 -1.9,1.78 ; -0.73,-0.007 cw(c-0.37,-0.354) 0.045,-0.075 ; 0.07,-0.095 ccw(c0.451,0.229) 0.88,-0.029 ; 1.9,-1.78 1.9,-1.45 ; 1.9,1.45 1.9,1.78 ; 7.95,-1.78 7.95,-1.5 ; 7.95,1.5 7.95,1.78 ; 8.1,-1.78 8.1,-1.425 ; 8.1,1.425 8.1,1.78 ; -11.15,-1.78 11.15,-1.78 11.15,1.78 -11.15,1.78 -11.15,-1.78
  text "+" at 9.3,-1.03 h2
  text "-" at -10.675,-1.025 h2
Notvisible:
  lines w0.1: -8.62,0 -7.62,0 ; -7.62,-1 -7.62,0 ; -7.62,1 -7.62,0 ; -6.62,0 -7.62,0 ; -3.54,0 -2.54,0 ; -2.54,-1 -2.54,0 ; -2.54,1 -2.54,0 ; -1.54,0 -2.54,0 ; -1,0 0,0 ; 0,-1 0,0 ; 0,1 0,0 ; 1,0 0,0 ; 1.54,0 2.54,0 ; 2.54,-1 2.54,0 ; 2.54,1 2.54,0 ; 3.54,0 2.54,0 ; 6.62,0 7.62,0 ; 7.62,-1 7.62,0 ; 7.62,1 7.62,0 ; 8.62,0 7.62,0
Mechanical 14:
  lines w0.1: -1.9,-1.78 -1.9,-1.272 ; -1.9,-0.764 -1.9,-0.256 ; -1.9,0.252 -1.9,0.76 ; -1.9,1.268 -1.9,1.78 ; 1.9,-1.78 1.9,-1.272 ; 1.9,-0.764 1.9,-0.256 ; 1.9,0.252 1.9,0.76 ; 1.9,1.268 1.9,1.78 ; 7.95,-1.78 7.95,1.78 ; -11.15,-1.78 11.15,-1.78 11.15,1.78 -11.15,1.78 -11.15,-1.78
  lines w0.2: -0.73,-0.007 cw(c-0.37,-0.354) 0.045,-0.075 ; 0.07,-0.095 ccw(c0.451,0.229) 0.88,-0.029
  text "+" at 9.3,-1.03 h2
  text "-" at -10.675,-1.025 h2
3D body "FAIRCHILD_GBU-V.stp": height 20.83, standoff -3.8, extent -11.15,-1.78 11.15,1.78

## FAIRCHILD_TO-3P03A_h [mm] "FAIRCHILD TO3,  3-Terminal - Horizontal Mount"
height 5
pads (4):
  rect 2.5x2.5 hole 1.8: 1(-5.45,0)
  round 2.5 hole 1.8: 2(0,0) 3(5.45,0)
  round 5.75 hole 3.5: 4(0,20.8)
Top Overlay:
  circle w0.2: c-4.55,17.4 r1
  circle w0.2: c4.55,17.4 r1
  lines w0.2: -7.9,13 ccw(c-7.9,14) -7.9,15 ; -7.9,20.3 -6.975,20.3 -4.562,24.321 4.562,24.321 6.975,20.3 7.873,20.3 ; -6.55,5.2 -6.55,1.789 -6.05,1.5 ; -4.85,1.5 -4.35,1.789 -4.35,5.2 ; -1.6,5.2 -1.6,2.077 -0.6,1.5 ; 0.6,1.5 1.6,2.077 1.6,5.2 ; 4.35,5.2 4.35,1.789 4.85,1.5 ; 6.05,1.5 6.55,1.789 6.55,5.2 ; 7.9,13 cw(c7.9,14) 7.9,15 ; -7.9,5.2 7.9,5.2 7.9,23.3 6.7,25.3 -6.7,25.3 -7.9,23.3 -7.9,5.2
Notvisible:
  lines w0.1: -5.95,0 -5.45,0 ; -5.45,-0.5 -5.45,0 ; -5.45,0.5 -5.45,0 ; -4.95,0 -5.45,0 ; -0.5,0 0,0 ; -0.5,20.8 0,20.8 ; 0,-0.5 0,0 ; 0,0.5 0,0 ; 0,20.3 0,20.8 ; 0,21.3 0,20.8 ; 0.5,0 0,0 ; 0.5,20.8 0,20.8 ; 4.95,0 5.45,0 ; 5.45,-0.5 5.45,0 ; 5.45,0.5 5.45,0 ; 5.95,0 5.45,0
Mechanical 14:
  circle w0.1: c0,20.8 r1.65
  circle w0.1: c-4.55,17.4 r1
  circle w0.1: c4.55,17.4 r1
  lines w0.1: -7.9,13 ccw(c-7.9,14) -7.9,15 ; -7.9,20.3 -6.975,20.3 -4.562,24.321 4.562,24.321 6.975,20.3 7.873,20.3 ; -6.55,5.2 -6.55,1.789 -6.05,1.5 -6.05,-0.374 ; -6.05,-0.375 -4.85,-0.375 -4.85,1.5 -4.35,1.789 -4.35,5.2 ; -1.6,5.2 -1.6,2.077 -0.6,1.5 -0.6,-0.375 0.6,-0.375 0.6,1.5 1.6,2.077 1.6,5.2 ; 4.35,5.2 4.35,1.789 4.85,1.5 4.85,-0.375 6.05,-0.375 ; 6.05,-0.349 6.05,1.5 6.55,1.789 6.55,5.2 ; 7.9,13 cw(c7.9,14) 7.9,15 ; -7.9,5.2 7.9,5.2 7.9,23.3 6.7,25.3 -6.7,25.3 -7.9,23.3 -7.9,5.2
3D body "FAIRCHILD_TO-3P03A_h.stp": height 5, standoff -2.45, extent -7.9,-0.375 7.9,25.3

## FAIRCHILD_TO-3P03A_hflip [mm] "FAIRCHILD TO3,  3-Terminal - Flipped Horizontal Mount"
height 5
pads (4):
  rect 2.5x2.5 hole 1.8: 1(5.45,0)
  round 2.5 hole 1.8: 2(0,0) 3(-5.45,0)
  round 5.75 hole 3.5: 4(0,20.8)
Top Overlay:
  lines w0.2: -7.9,20.3 -6.9,20.3 -6.9,8.3 6.9,8.3 6.9,20.3 7.9,20.3 ; -6.55,5.2 -6.55,1.789 -6.05,1.5 ; -4.85,1.5 -4.35,1.789 -4.35,5.2 ; -1.6,5.2 -1.6,2.077 -0.6,1.5 ; 0.6,1.5 1.6,2.077 1.6,5.2 ; 4.35,5.2 4.35,1.789 4.85,1.5 ; 6.05,1.5 6.55,1.789 6.55,5.2 ; -7.9,5.2 7.9,5.2 7.9,23.3 6.7,25.3 -6.7,25.3 -7.9,23.3 -7.9,5.2
Notvisible:
  lines w0.1: -5.95,0 -5.45,0 ; -5.45,-0.5 -5.45,0 ; -5.45,0.5 -5.45,0 ; -4.95,0 -5.45,0 ; -0.5,0 0,0 ; -0.5,20.8 0,20.8 ; 0,-0.5 0,0 ; 0,0.5 0,0 ; 0,20.3 0,20.8 ; 0,21.3 0,20.8 ; 0.5,0 0,0 ; 0.5,20.8 0,20.8 ; 4.95,0 5.45,0 ; 5.45,-0.5 5.45,0 ; 5.45,0.5 5.45,0 ; 5.95,0 5.45,0
Mechanical 14:
  circle w0.1: c0,20.8 r3.6
  circle w0.1: c0,20.8 r1.65
  lines w0.1: -7.9,20.3 -6.9,20.3 -6.9,8.3 6.9,8.3 6.9,20.3 7.9,20.3 ; -6.55,5.2 -6.55,1.789 -6.05,1.5 -6.05,-0.374 ; -6.05,-0.375 -4.85,-0.375 -4.85,1.5 -4.35,1.789 -4.35,5.2 ; -1.6,5.2 -1.6,2.077 -0.6,1.5 -0.6,-0.375 0.6,-0.375 0.6,1.5 1.6,2.077 1.6,5.2 ; 4.35,5.2 4.35,1.789 4.85,1.5 4.85,-0.375 6.05,-0.375 ; 6.05,-0.349 6.05,1.5 6.55,1.789 6.55,5.2 ; -7.9,5.2 7.9,5.2 7.9,23.3 6.7,25.3 -6.7,25.3 -7.9,23.3 -7.9,5.2
3D body "FAIRCHILD_TO-3P03A_hflip.stp": height 5, standoff -3.8, extent -7.9,-0.375 7.9,25.3

## FAIRCHILD_TO-3P03A_v [mm] "FAIRCHILD TO3,  3-Terminal - Vertical Mount"
height 23.8
pads (3):
  rect 2.5x2.5 hole 1.8: 1(-5.45,0)
  round 2.5 hole 1.8: 2(0,0) 3(5.45,0)
Top Overlay:
  lines w0.2: -7.05,1.535 -7.9,1.535 ; -3.85,1.535 -0.605,1.535 ; 0.605,1.535 4.845,1.535 ; 6.055,1.535 7.9,1.535 ; -7.9,1.535 -7.9,3.175 7.9,3.175 7.9,1.535 ; -7.9,1.535 -7.9,1.375 -7.473,-1.825 7.473,-1.825 7.9,1.375 7.9,1.535
Notvisible:
  lines w0.1: -5.95,0 -5.45,0 ; -5.45,-0.5 -5.45,0 ; -5.45,0.5 -5.45,0 ; -4.95,0 -5.45,0 ; -0.5,0 0,0 ; 0,-0.5 0,0 ; 0,0.5 0,0 ; 0.5,0 0,0 ; 4.95,0 5.45,0 ; 5.45,-0.5 5.45,0 ; 5.45,0.5 5.45,0 ; 5.95,0 5.45,0
Mechanical 14:
  lines w0.1: -7.9,1.535 7.9,1.535 ; -7.9,1.535 -7.9,3.175 0,3.175 7.9,3.175 7.9,1.535 ; -7.9,1.535 -7.9,1.375 -7.473,-1.825 7.473,-1.825 7.9,1.375 7.9,1.535
3D body "FAIRCHILD_TO-3P03A_v.stp": height 25.5, standoff -4, extent -7.9,-1.825 7.9,3.175

## FAIRCHILD_TO-3PF_h [mm] "FAIRCHILD TO-3PF 3-Terminal - Horizontal Mount"
height 5.7
pads (4):
  rect 2.2x2.2 hole 1.5: 1(-5.45,0)
  round 2.2 hole 1.5: 2(0,0) 3(5.45,0)
  round 5.75 hole 3.6: 4(0,27.1)
Top Overlay:
  lines w0.2: -7.579,21.6 7.579,21.6 ; -6.45,7.1 -6.45,2.6 -5.85,2 -5.85,1.446 ; -5.05,1.446 -5.05,2 -4.45,2.6 -4.45,7.1 ; -1,5.1 -1,2.6 -0.4,2 ; -0.4,1.446 -0.4,2 ; 0.4,1.446 0.4,2 ; 1,5.1 1,2.6 0.4,2 ; 4.45,7.1 4.45,2.6 5.05,2 5.05,1.446 ; 5.85,1.446 5.85,2 6.45,2.6 6.45,7.1 ; -0.4,2 0.4,2 ; -7.75,7.1 -7.75,31.6 7.75,31.6 7.75,7.1 2,7.1 2,5.1 -2,5.1 -2,7.1 -7.75,7.1
Notvisible:
  lines w0.1: -6.45,0 -5.45,0 ; -5.45,-1 -5.45,0 ; -5.45,1 -5.45,0 ; -4.45,0 -5.45,0 ; -1,0 0,0 ; -1,27.1 0,27.1 ; 0,-1 0,0 ; 0,1 0,0 ; 0,26.1 0,27.1 ; 0,28.1 0,27.1 ; 1,0 0,0 ; 1,27.1 0,27.1 ; 4.45,0 5.45,0 ; 5.45,-1 5.45,0 ; 5.45,1 5.45,0 ; 6.45,0 5.45,0
Mechanical 14:
  circle w0.1: c0,27.1 r1.8
  lines w0.1: -7.579,21.6 7.579,21.6 ; -6.45,7.1 -6.45,2.6 -5.85,2 -5.85,-0.45 -5.05,-0.45 -5.05,2 -4.45,2.6 -4.45,7.1 ; -1,5.1 -1,2.6 -0.4,2 ; 1,5.1 1,2.6 0.4,2 ; 4.45,7.1 4.45,2.6 5.05,2 5.05,-0.45 5.85,-0.45 5.85,2 6.45,2.6 6.45,7.1 ; -0.4,2 -0.4,-0.45 0.4,-0.45 0.4,2 ; -0.4,2 0.4,2 ; -7.75,7.1 -7.75,31.6 7.75,31.6 7.75,7.1 2,7.1 2,5.1 -2,5.1 -2,7.1 -7.75,7.1
3D body "FAIRCHILD_TO-3PF_h.stp": height 5.5, standoff -3.8, extent -7.75,-0.45 7.75,31.6